# Altium schematic symbol library jlcpcb_2025_04_capacitors_extended_0805.schlib: 3281 symbols (part 9 of 18)
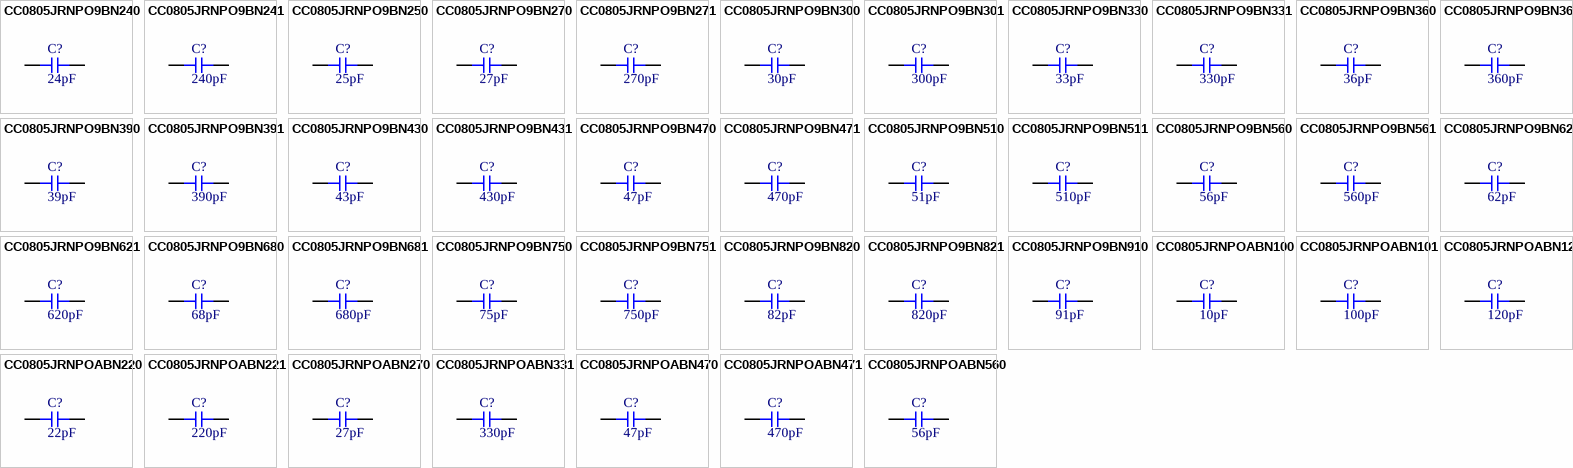
[diagram p90: symbols CC0805JRNPO9BN240 to CC0805JRNPOABN560]

## CC0805JRNPOABN220
designator C?  Capacitance: 22pF  (hidden comment: *)
Capacitor, Ceramic (MLCC), 22pF, ±5%, 200V, NP0, ±5%, SMD 0805; Manufacturer: YAGEO; Manufacturer Part Number: CC0805JRNPOABN220; Package Size: 0805; JLCPCB Basic Part: No; JLCPCB Part Number: C576968; Supplier 1: LCSC; Category: Capacitors - MLCC; Supplier Part Number 1: C576968; Tolerance: ±5%; Voltage Rating: 200V; Temperature Coefficient: NP0; RoHS: Yes; ComponentLink1Description: Datasheet; ComponentLink1URL: https://wmsc.lcsc.com/wmsc/upload/file/pdf/v2/lcsc/2209231730_YAGEO-CC0805JRNPOABN220_C576968.pdf; ComponentLink2Description: JLCPCB Part URL; ComponentLink2URL: https://jlcpcb.com/partdetail/C576968; ComponentLink3Description: LCSC Part URL; ComponentLink3URL: https://lcsc.com/product-detail/Multilayer-Ceramic-Capacitors-MLCC---SMD-SMT_YAGEO-YAGEO-CC0805JRNPOABN220_C576968.html
footprint CAP-0805 (0805 (2012M) Capacitor)
pins: 1, 2

## CC0805JRNPOABN221
designator C?  Capacitance: 220pF  (hidden comment: *)
Capacitor, Ceramic (MLCC), 220pF, ±5%, 200V, NP0, ±5%, SMD 0805; Manufacturer: YAGEO; Manufacturer Part Number: CC0805JRNPOABN221; Package Size: 0805; JLCPCB Basic Part: No; JLCPCB Part Number: C326848; Supplier 1: LCSC; Category: Capacitors - MLCC; Supplier Part Number 1: C326848; Tolerance: ±5%; Voltage Rating: 200V; Temperature Coefficient: NP0; RoHS: Yes; ComponentLink1Description: Datasheet; ComponentLink1URL: https://wmsc.lcsc.com/wmsc/upload/file/pdf/v2/lcsc/1811061214_YAGEO-CC0805JRNPOABN221_C326848.pdf; ComponentLink2Description: JLCPCB Part URL; ComponentLink2URL: https://jlcpcb.com/partdetail/C326848; ComponentLink3Description: LCSC Part URL; ComponentLink3URL: https://lcsc.com/product-detail/Multilayer-Ceramic-Capacitors-MLCC---SMD-SMT_YAGEO-YAGEO-CC0805JRNPOABN221_C326848.html
footprint CAP-0805 (0805 (2012M) Capacitor)
pins: 1, 2

## CC0805JRNPOABN270
designator C?  Capacitance: 27pF  (hidden comment: *)
Capacitor, Ceramic (MLCC), 27pF, ±5%, 200V, NP0, ±5%, SMD 0805; Manufacturer: YAGEO; Manufacturer Part Number: CC0805JRNPOABN270; Package Size: 0805; JLCPCB Basic Part: No; JLCPCB Part Number: C527209; Supplier 1: LCSC; Category: Capacitors - MLCC; Supplier Part Number 1: C527209; Tolerance: ±5%; Voltage Rating: 200V; Temperature Coefficient: NP0; RoHS: Yes; ComponentLink1Description: Datasheet; ComponentLink1URL: https://wmsc.lcsc.com/wmsc/upload/file/pdf/v2/lcsc/2006031835_YAGEO-CC0805JRNPOABN270_C527209.pdf; ComponentLink2Description: JLCPCB Part URL; ComponentLink2URL: https://jlcpcb.com/partdetail/C527209; ComponentLink3Description: LCSC Part URL; ComponentLink3URL: https://lcsc.com/product-detail/Multilayer-Ceramic-Capacitors-MLCC---SMD-SMT_YAGEO-YAGEO-CC0805JRNPOABN270_C527209.html
footprint CAP-0805 (0805 (2012M) Capacitor)
pins: 1, 2

## CC0805JRNPOABN331
designator C?  Capacitance: 330pF  (hidden comment: *)
Capacitor, Ceramic (MLCC), 330pF, ±5%, 200V, NP0, ±5%, SMD 0805; Manufacturer: YAGEO; Manufacturer Part Number: CC0805JRNPOABN331; Package Size: 0805; JLCPCB Basic Part: No; JLCPCB Part Number: C113837; Supplier 1: LCSC; Category: Capacitors - MLCC; Supplier Part Number 1: C113837; Tolerance: ±5%; Voltage Rating: 200V; Temperature Coefficient: NP0; RoHS: Yes; ComponentLink1Description: Datasheet; ComponentLink1URL: https://wmsc.lcsc.com/wmsc/upload/file/pdf/v2/lcsc/2304140030_YAGEO-CC0805JRNPOABN331_C113837.pdf; ComponentLink2Description: JLCPCB Part URL; ComponentLink2URL: https://jlcpcb.com/partdetail/C113837; ComponentLink3Description: LCSC Part URL; ComponentLink3URL: https://lcsc.com/product-detail/Multilayer-Ceramic-Capacitors-MLCC---SMD-SMT_YAGEO-YAGEO-CC0805JRNPOABN331_C113837.html
footprint CAP-0805 (0805 (2012M) Capacitor)
pins: 1, 2

## CC0805JRNPOABN470
designator C?  Capacitance: 47pF  (hidden comment: *)
Capacitor, Ceramic (MLCC), 47pF, ±5%, 200V, NP0, ±5%, SMD 0805; Manufacturer: YAGEO; Manufacturer Part Number: CC0805JRNPOABN470; Package Size: 0805; JLCPCB Basic Part: No; JLCPCB Part Number: C576969; Supplier 1: LCSC; Category: Capacitors - MLCC; Supplier Part Number 1: C576969; Tolerance: ±5%; Voltage Rating: 200V; Temperature Coefficient: NP0; RoHS: Yes; ComponentLink1Description: Datasheet; ComponentLink1URL: https://wmsc.lcsc.com/wmsc/upload/file/pdf/v2/lcsc/2006111833_YAGEO-CC0805JRNPOABN470_C576969.pdf; ComponentLink2Description: JLCPCB Part URL; ComponentLink2URL: https://jlcpcb.com/partdetail/C576969; ComponentLink3Description: LCSC Part URL; ComponentLink3URL: https://lcsc.com/product-detail/Multilayer-Ceramic-Capacitors-MLCC---SMD-SMT_YAGEO-YAGEO-CC0805JRNPOABN470_C576969.html
footprint CAP-0805 (0805 (2012M) Capacitor)
pins: 1, 2

## CC0805JRNPOABN471
designator C?  Capacitance: 470pF  (hidden comment: *)
Capacitor, Ceramic (MLCC), 470pF, ±5%, 200V, NP0, ±5%, SMD 0805; Manufacturer: YAGEO; Manufacturer Part Number: CC0805JRNPOABN471; Package Size: 0805; JLCPCB Basic Part: No; JLCPCB Part Number: C576970; Supplier 1: LCSC; Category: Capacitors - MLCC; Supplier Part Number 1: C576970; Tolerance: ±5%; Voltage Rating: 200V; Temperature Coefficient: NP0; RoHS: Yes; ComponentLink1Description: Datasheet; ComponentLink1URL: https://wmsc.lcsc.com/wmsc/upload/file/pdf/v2/lcsc/2204021130_YAGEO-CC0805JRNPOABN471_C576970.pdf; ComponentLink2Description: JLCPCB Part URL; ComponentLink2URL: https://jlcpcb.com/partdetail/C576970; ComponentLink3Description: LCSC Part URL; ComponentLink3URL: https://lcsc.com/product-detail/Multilayer-Ceramic-Capacitors-MLCC---SMD-SMT_YAGEO-YAGEO-CC0805JRNPOABN471_C576970.html
footprint CAP-0805 (0805 (2012M) Capacitor)
pins: 1, 2

## CC0805JRNPOABN560
designator C?  Capacitance: 56pF  (hidden comment: *)
Capacitor, Ceramic (MLCC), 56pF, ±5%, 200V, NP0, ±5%, SMD 0805; Manufacturer: YAGEO; Manufacturer Part Number: CC0805JRNPOABN560; Package Size: 0805; JLCPCB Basic Part: No; JLCPCB Part Number: C527210; Supplier 1: LCSC; Category: Capacitors - MLCC; Supplier Part Number 1: C527210; Tolerance: ±5%; Voltage Rating: 200V; Temperature Coefficient: NP0; RoHS: Yes; ComponentLink1Description: Datasheet; ComponentLink1URL: https://wmsc.lcsc.com/wmsc/upload/file/pdf/v2/lcsc/2005262134_YAGEO-CC0805JRNPOABN560_C527210.pdf; ComponentLink2Description: JLCPCB Part URL; ComponentLink2URL: https://jlcpcb.com/partdetail/C527210; ComponentLink3Description: LCSC Part URL; ComponentLink3URL: https://lcsc.com/product-detail/Multilayer-Ceramic-Capacitors-MLCC---SMD-SMT_YAGEO-YAGEO-CC0805JRNPOABN560_C527210.html
footprint CAP-0805 (0805 (2012M) Capacitor)
pins: 1, 2

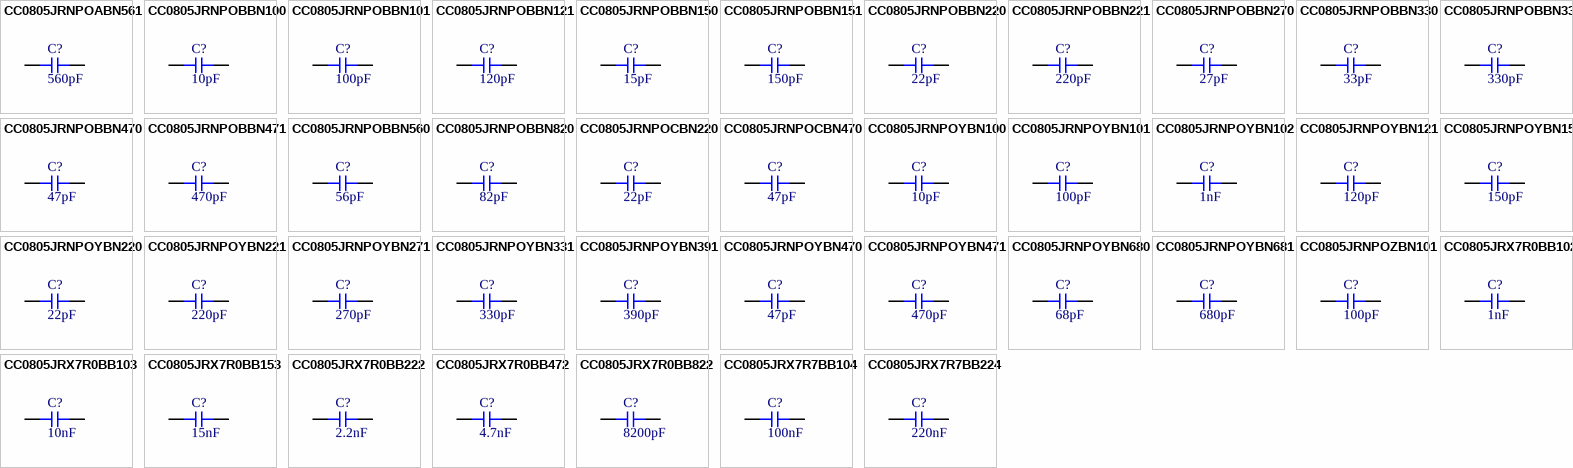
[diagram p37: symbols CC0805JRNPOABN561 to CC0805JRX7R7BB224]

## CC0805JRNPOABN561
designator C?  Capacitance: 560pF  (hidden comment: *)
Capacitor, Ceramic (MLCC), 560pF, ±5%, 200V, NP0, ±5%, SMD 0805; Manufacturer: YAGEO; Manufacturer Part Number: CC0805JRNPOABN561; Package Size: 0805; JLCPCB Basic Part: No; JLCPCB Part Number: C576971; Supplier 1: LCSC; Category: Capacitors - MLCC; Supplier Part Number 1: C576971; Tolerance: ±5%; Voltage Rating: 200V; Temperature Coefficient: NP0; RoHS: Yes; ComponentLink1Description: Datasheet; ComponentLink1URL: https://wmsc.lcsc.com/wmsc/upload/file/pdf/v2/lcsc/2006091814_YAGEO-CC0805JRNPOABN561_C576971.pdf; ComponentLink2Description: JLCPCB Part URL; ComponentLink2URL: https://jlcpcb.com/partdetail/C576971; ComponentLink3Description: LCSC Part URL; ComponentLink3URL: https://lcsc.com/product-detail/Multilayer-Ceramic-Capacitors-MLCC---SMD-SMT_YAGEO-YAGEO-CC0805JRNPOABN561_C576971.html
footprint CAP-0805 (0805 (2012M) Capacitor)
pins: 1, 2

## CC0805JRNPOBBN100
designator C?  Capacitance: 10pF  (hidden comment: *)
Capacitor, Ceramic (MLCC), 10pF, ±5%, 500V, NP0, ±5%, SMD 0805; Manufacturer: YAGEO; Manufacturer Part Number: CC0805JRNPOBBN100; Package Size: 0805; JLCPCB Basic Part: No; JLCPCB Part Number: C309488; Supplier 1: LCSC; Category: Capacitors - MLCC; Supplier Part Number 1: C309488; Tolerance: ±5%; Voltage Rating: 500V; Temperature Coefficient: NP0; RoHS: Yes; ComponentLink1Description: Datasheet; ComponentLink1URL: https://wmsc.lcsc.com/wmsc/upload/file/pdf/v2/lcsc/1811031143_YAGEO-CC0805JRNPOBBN100_C309488.pdf; ComponentLink2Description: JLCPCB Part URL; ComponentLink2URL: https://jlcpcb.com/partdetail/C309488; ComponentLink3Description: LCSC Part URL; ComponentLink3URL: https://lcsc.com/product-detail/Multilayer-Ceramic-Capacitors-MLCC---SMD-SMT_YAGEO-YAGEO-CC0805JRNPOBBN100_C309488.html
footprint CAP-0805 (0805 (2012M) Capacitor)
pins: 1, 2

## CC0805JRNPOBBN101
designator C?  Capacitance: 100pF  (hidden comment: *)
Capacitor, Ceramic (MLCC), 100pF, ±5%, 500V, NP0, ±5%, SMD 0805; Manufacturer: YAGEO; Manufacturer Part Number: CC0805JRNPOBBN101; Package Size: 0805; JLCPCB Basic Part: No; JLCPCB Part Number: C107122; Supplier 1: LCSC; Category: Capacitors - MLCC; Supplier Part Number 1: C107122; Tolerance: ±5%; Voltage Rating: 500V; Temperature Coefficient: NP0; RoHS: Yes; ComponentLink1Description: Datasheet; ComponentLink1URL: https://wmsc.lcsc.com/wmsc/upload/file/pdf/v2/lcsc/2304140030_YAGEO-CC0805JRNPOBBN101_C107122.pdf; ComponentLink2Description: JLCPCB Part URL; ComponentLink2URL: https://jlcpcb.com/partdetail/C107122; ComponentLink3Description: LCSC Part URL; ComponentLink3URL: https://lcsc.com/product-detail/Multilayer-Ceramic-Capacitors-MLCC---SMD-SMT_YAGEO-YAGEO-CC0805JRNPOBBN101_C107122.html
footprint CAP-0805 (0805 (2012M) Capacitor)
pins: 1, 2

## CC0805JRNPOBBN121
designator C?  Capacitance: 120pF  (hidden comment: *)
Capacitor, Ceramic (MLCC), 120pF, ±5%, 500V, NP0, ±5%, SMD 0805; Manufacturer: YAGEO; Manufacturer Part Number: CC0805JRNPOBBN121; Package Size: 0805; JLCPCB Basic Part: No; JLCPCB Part Number: C527211; Supplier 1: LCSC; Category: Capacitors - MLCC; Supplier Part Number 1: C527211; Tolerance: ±5%; Voltage Rating: 500V; Temperature Coefficient: NP0; RoHS: Yes; ComponentLink1Description: Datasheet; ComponentLink1URL: https://wmsc.lcsc.com/wmsc/upload/file/pdf/v2/lcsc/2006031835_YAGEO-CC0805JRNPOBBN121_C527211.pdf; ComponentLink2Description: JLCPCB Part URL; ComponentLink2URL: https://jlcpcb.com/partdetail/C527211; ComponentLink3Description: LCSC Part URL; ComponentLink3URL: https://lcsc.com/product-detail/Multilayer-Ceramic-Capacitors-MLCC---SMD-SMT_YAGEO-YAGEO-CC0805JRNPOBBN121_C527211.html
footprint CAP-0805 (0805 (2012M) Capacitor)
pins: 1, 2

## CC0805JRNPOBBN150
designator C?  Capacitance: 15pF  (hidden comment: *)
Capacitor, Ceramic (MLCC), 15pF, ±5%, 500V, NP0, ±5%, SMD 0805; Manufacturer: YAGEO; Manufacturer Part Number: CC0805JRNPOBBN150; Package Size: 0805; JLCPCB Basic Part: No; JLCPCB Part Number: C576974; Supplier 1: LCSC; Category: Capacitors - MLCC; Supplier Part Number 1: C576974; Tolerance: ±5%; Voltage Rating: 500V; Temperature Coefficient: NP0; RoHS: Yes; ComponentLink1Description: Datasheet; ComponentLink1URL: https://wmsc.lcsc.com/wmsc/upload/file/pdf/v2/lcsc/2204251630_YAGEO-CC0805JRNPOBBN150_C576974.pdf; ComponentLink2Description: JLCPCB Part URL; ComponentLink2URL: https://jlcpcb.com/partdetail/C576974; ComponentLink3Description: LCSC Part URL; ComponentLink3URL: https://lcsc.com/product-detail/Multilayer-Ceramic-Capacitors-MLCC---SMD-SMT_YAGEO-YAGEO-CC0805JRNPOBBN150_C576974.html
footprint CAP-0805 (0805 (2012M) Capacitor)
pins: 1, 2

## CC0805JRNPOBBN151
designator C?  Capacitance: 150pF  (hidden comment: *)
Capacitor, Ceramic (MLCC), 150pF, ±5%, 500V, NP0, ±5%, SMD 0805; Manufacturer: YAGEO; Manufacturer Part Number: CC0805JRNPOBBN151; Package Size: 0805; JLCPCB Basic Part: No; JLCPCB Part Number: C576975; Supplier 1: LCSC; Category: Capacitors - MLCC; Supplier Part Number 1: C576975; Tolerance: ±5%; Voltage Rating: 500V; Temperature Coefficient: NP0; RoHS: Yes; ComponentLink1Description: Datasheet; ComponentLink1URL: https://wmsc.lcsc.com/wmsc/upload/file/pdf/v2/lcsc/2008171234_YAGEO-CC0805JRNPOBBN151_C576975.pdf; ComponentLink2Description: JLCPCB Part URL; ComponentLink2URL: https://jlcpcb.com/partdetail/C576975; ComponentLink3Description: LCSC Part URL; ComponentLink3URL: https://lcsc.com/product-detail/Multilayer-Ceramic-Capacitors-MLCC---SMD-SMT_YAGEO-YAGEO-CC0805JRNPOBBN151_C576975.html
footprint CAP-0805 (0805 (2012M) Capacitor)
pins: 1, 2

## CC0805JRNPOBBN220
designator C?  Capacitance: 22pF  (hidden comment: *)
Capacitor, Ceramic (MLCC), 22pF, ±5%, 500V, NP0, ±5%, SMD 0805; Manufacturer: YAGEO; Manufacturer Part Number: CC0805JRNPOBBN220; Package Size: 0805; JLCPCB Basic Part: No; JLCPCB Part Number: C107123; Supplier 1: LCSC; Category: Capacitors - MLCC; Supplier Part Number 1: C107123; Tolerance: ±5%; Voltage Rating: 500V; Temperature Coefficient: NP0; RoHS: Yes; ComponentLink1Description: Datasheet; ComponentLink1URL: https://wmsc.lcsc.com/wmsc/upload/file/pdf/v2/lcsc/2304140030_YAGEO-CC0805JRNPOBBN220_C107123.pdf; ComponentLink2Description: JLCPCB Part URL; ComponentLink2URL: https://jlcpcb.com/partdetail/C107123; ComponentLink3Description: LCSC Part URL; ComponentLink3URL: https://lcsc.com/product-detail/Multilayer-Ceramic-Capacitors-MLCC---SMD-SMT_YAGEO-YAGEO-CC0805JRNPOBBN220_C107123.html
footprint CAP-0805 (0805 (2012M) Capacitor)
pins: 1, 2

## CC0805JRNPOBBN221
designator C?  Capacitance: 220pF  (hidden comment: *)
Capacitor, Ceramic (MLCC), 220pF, ±5%, 500V, NP0, ±5%, SMD 0805; Manufacturer: YAGEO; Manufacturer Part Number: CC0805JRNPOBBN221; Package Size: 0805; JLCPCB Basic Part: No; JLCPCB Part Number: C576977; Supplier 1: LCSC; Category: Capacitors - MLCC; Supplier Part Number 1: C576977; Tolerance: ±5%; Voltage Rating: 500V; Temperature Coefficient: NP0; RoHS: Yes; ComponentLink1Description: Datasheet; ComponentLink1URL: https://wmsc.lcsc.com/wmsc/upload/file/pdf/v2/lcsc/2008171234_YAGEO-CC0805JRNPOBBN221_C576977.pdf; ComponentLink2Description: JLCPCB Part URL; ComponentLink2URL: https://jlcpcb.com/partdetail/C576977; ComponentLink3Description: LCSC Part URL; ComponentLink3URL: https://lcsc.com/product-detail/Multilayer-Ceramic-Capacitors-MLCC---SMD-SMT_YAGEO-YAGEO-CC0805JRNPOBBN221_C576977.html
footprint CAP-0805 (0805 (2012M) Capacitor)
pins: 1, 2

## CC0805JRNPOBBN270
designator C?  Capacitance: 27pF  (hidden comment: *)
Capacitor, Ceramic (MLCC), 27pF, ±5%, 500V, NP0, ±5%, SMD 0805; Manufacturer: YAGEO; Manufacturer Part Number: CC0805JRNPOBBN270; Package Size: 0805; JLCPCB Basic Part: No; JLCPCB Part Number: C576978; Supplier 1: LCSC; Category: Capacitors - MLCC; Supplier Part Number 1: C576978; Tolerance: ±5%; Voltage Rating: 500V; Temperature Coefficient: NP0; RoHS: Yes; ComponentLink1Description: Datasheet; ComponentLink1URL: https://wmsc.lcsc.com/wmsc/upload/file/pdf/v2/lcsc/2209151800_YAGEO-CC0805JRNPOBBN270_C576978.pdf; ComponentLink2Description: JLCPCB Part URL; ComponentLink2URL: https://jlcpcb.com/partdetail/C576978; ComponentLink3Description: LCSC Part URL; ComponentLink3URL: https://lcsc.com/product-detail/Multilayer-Ceramic-Capacitors-MLCC---SMD-SMT_YAGEO-YAGEO-CC0805JRNPOBBN270_C576978.html
footprint CAP-0805 (0805 (2012M) Capacitor)
pins: 1, 2

## CC0805JRNPOBBN330
designator C?  Capacitance: 33pF  (hidden comment: *)
Capacitor, Ceramic (MLCC), 33pF, ±5%, 500V, NP0, ±5%, SMD 0805; Manufacturer: YAGEO; Manufacturer Part Number: CC0805JRNPOBBN330; Package Size: 0805; JLCPCB Basic Part: No; JLCPCB Part Number: C113838; Supplier 1: LCSC; Category: Capacitors - MLCC; Supplier Part Number 1: C113838; Tolerance: ±5%; Voltage Rating: 500V; Temperature Coefficient: NP0; RoHS: Yes; ComponentLink1Description: Datasheet; ComponentLink1URL: https://wmsc.lcsc.com/wmsc/upload/file/pdf/v2/lcsc/2304140030_YAGEO-CC0805JRNPOBBN330_C113838.pdf; ComponentLink2Description: JLCPCB Part URL; ComponentLink2URL: https://jlcpcb.com/partdetail/C113838; ComponentLink3Description: LCSC Part URL; ComponentLink3URL: https://lcsc.com/product-detail/Multilayer-Ceramic-Capacitors-MLCC---SMD-SMT_YAGEO-YAGEO-CC0805JRNPOBBN330_C113838.html
footprint CAP-0805 (0805 (2012M) Capacitor)
pins: 1, 2

## CC0805JRNPOBBN331
designator C?  Capacitance: 330pF  (hidden comment: *)
Capacitor, Ceramic (MLCC), 330pF, ±5%, 500V, NP0, ±5%, SMD 0805; Manufacturer: YAGEO; Manufacturer Part Number: CC0805JRNPOBBN331; Package Size: 0805; JLCPCB Basic Part: No; JLCPCB Part Number: C576979; Supplier 1: LCSC; Category: Capacitors - MLCC; Supplier Part Number 1: C576979; Tolerance: ±5%; Voltage Rating: 500V; Temperature Coefficient: NP0; RoHS: Yes; ComponentLink1Description: Datasheet; ComponentLink1URL: https://wmsc.lcsc.com/wmsc/upload/file/pdf/v2/lcsc/2008171234_YAGEO-CC0805JRNPOBBN331_C576979.pdf; ComponentLink2Description: JLCPCB Part URL; ComponentLink2URL: https://jlcpcb.com/partdetail/C576979; ComponentLink3Description: LCSC Part URL; ComponentLink3URL: https://lcsc.com/product-detail/Multilayer-Ceramic-Capacitors-MLCC---SMD-SMT_YAGEO-YAGEO-CC0805JRNPOBBN331_C576979.html
footprint CAP-0805 (0805 (2012M) Capacitor)
pins: 1, 2

## CC0805JRNPOBBN470
designator C?  Capacitance: 47pF  (hidden comment: *)
Capacitor, Ceramic (MLCC), 47pF, ±5%, 500V, NP0, ±5%, SMD 0805; Manufacturer: YAGEO; Manufacturer Part Number: CC0805JRNPOBBN470; Package Size: 0805; JLCPCB Basic Part: No; JLCPCB Part Number: C113839; Supplier 1: LCSC; Category: Capacitors - MLCC; Supplier Part Number 1: C113839; Tolerance: ±5%; Voltage Rating: 500V; Temperature Coefficient: NP0; RoHS: Yes; ComponentLink1Description: Datasheet; ComponentLink1URL: https://wmsc.lcsc.com/wmsc/upload/file/pdf/v2/lcsc/2304140030_YAGEO-CC0805JRNPOBBN470_C113839.pdf; ComponentLink2Description: JLCPCB Part URL; ComponentLink2URL: https://jlcpcb.com/partdetail/C113839; ComponentLink3Description: LCSC Part URL; ComponentLink3URL: https://lcsc.com/product-detail/Multilayer-Ceramic-Capacitors-MLCC---SMD-SMT_YAGEO-YAGEO-CC0805JRNPOBBN470_C113839.html
footprint CAP-0805 (0805 (2012M) Capacitor)
pins: 1, 2

## CC0805JRNPOBBN471
designator C?  Capacitance: 470pF  (hidden comment: *)
Capacitor, Ceramic (MLCC), 470pF, ±5%, 500V, NP0, ±5%, SMD 0805; Manufacturer: YAGEO; Manufacturer Part Number: CC0805JRNPOBBN471; Package Size: 0805; JLCPCB Basic Part: No; JLCPCB Part Number: C576981; Supplier 1: LCSC; Category: Capacitors - MLCC; Supplier Part Number 1: C576981; Tolerance: ±5%; Voltage Rating: 500V; Temperature Coefficient: NP0; RoHS: Yes; ComponentLink1Description: Datasheet; ComponentLink1URL: https://wmsc.lcsc.com/wmsc/upload/file/pdf/v2/lcsc/2204291416_YAGEO-CC0805JRNPOBBN471_C576981.pdf; ComponentLink2Description: JLCPCB Part URL; ComponentLink2URL: https://jlcpcb.com/partdetail/C576981; ComponentLink3Description: LCSC Part URL; ComponentLink3URL: https://lcsc.com/product-detail/Multilayer-Ceramic-Capacitors-MLCC---SMD-SMT_YAGEO-YAGEO-CC0805JRNPOBBN471_C576981.html
footprint CAP-0805 (0805 (2012M) Capacitor)
pins: 1, 2

## CC0805JRNPOBBN560
designator C?  Capacitance: 56pF  (hidden comment: *)
Capacitor, Ceramic (MLCC), 56pF, ±5%, 500V, NP0, ±5%, SMD 0805; Manufacturer: YAGEO; Manufacturer Part Number: CC0805JRNPOBBN560; Package Size: 0805; JLCPCB Basic Part: No; JLCPCB Part Number: C596325; Supplier 1: LCSC; Category: Capacitors - MLCC; Supplier Part Number 1: C596325; Tolerance: ±5%; Voltage Rating: 500V; Temperature Coefficient: NP0; RoHS: Yes; ComponentLink1Description: Datasheet; ComponentLink1URL: https://wmsc.lcsc.com/wmsc/upload/file/pdf/v2/lcsc/2006091816_YAGEO-CC0805JRNPOBBN560_C596325.pdf; ComponentLink2Description: JLCPCB Part URL; ComponentLink2URL: https://jlcpcb.com/partdetail/C596325; ComponentLink3Description: LCSC Part URL; ComponentLink3URL: https://lcsc.com/product-detail/Multilayer-Ceramic-Capacitors-MLCC---SMD-SMT_YAGEO-YAGEO-CC0805JRNPOBBN560_C596325.html
footprint CAP-0805 (0805 (2012M) Capacitor)
pins: 1, 2

## CC0805JRNPOBBN820
designator C?  Capacitance: 82pF  (hidden comment: *)
Capacitor, Ceramic (MLCC), 82pF, ±5%, 500V, C0G, ±5%, SMD 0805; Manufacturer: YAGEO; Manufacturer Part Number: CC0805JRNPOBBN820; Package Size: 0805; JLCPCB Basic Part: No; JLCPCB Part Number: C3836573; Supplier 1: LCSC; Category: Capacitors - MLCC; Supplier Part Number 1: C3836573; Tolerance: ±5%; Voltage Rating: 500V; Temperature Coefficient: C0G; RoHS: Yes; ComponentLink1Description: Datasheet; ComponentLink1URL: https://wmsc.lcsc.com/wmsc/upload/file/pdf/v2/lcsc/2311211121_YAGEO-CC0805JRNPOBBN820_C3836573.pdf; ComponentLink2Description: JLCPCB Part URL; ComponentLink2URL: https://jlcpcb.com/partdetail/C3836573; ComponentLink3Description: LCSC Part URL; ComponentLink3URL: https://lcsc.com/product-detail/Multilayer-Ceramic-Capacitors-MLCC---SMD-SMT_YAGEO-YAGEO-CC0805JRNPOBBN820_C3836573.html
footprint CAP-0805 (0805 (2012M) Capacitor)
pins: 1, 2

## CC0805JRNPOCBN220
designator C?  Capacitance: 22pF  (hidden comment: *)
Capacitor, Ceramic (MLCC), 22pF, ±5%, 1kV, NP0, ±5%, SMD 0805; Manufacturer: YAGEO; Manufacturer Part Number: CC0805JRNPOCBN220; Package Size: 0805; JLCPCB Basic Part: No; JLCPCB Part Number: C113840; Supplier 1: LCSC; Category: Capacitors - MLCC; Supplier Part Number 1: C113840; Tolerance: ±5%; Voltage Rating: 1kV; Temperature Coefficient: NP0; RoHS: Yes; ComponentLink1Description: Datasheet; ComponentLink1URL: https://wmsc.lcsc.com/wmsc/upload/file/pdf/v2/lcsc/2304140030_YAGEO-CC0805JRNPOCBN220_C113840.pdf; ComponentLink2Description: JLCPCB Part URL; ComponentLink2URL: https://jlcpcb.com/partdetail/C113840; ComponentLink3Description: LCSC Part URL; ComponentLink3URL: https://lcsc.com/product-detail/Multilayer-Ceramic-Capacitors-MLCC---SMD-SMT_YAGEO-YAGEO-CC0805JRNPOCBN220_C113840.html
footprint CAP-0805 (0805 (2012M) Capacitor)
pins: 1, 2

## CC0805JRNPOCBN470
designator C?  Capacitance: 47pF  (hidden comment: *)
Capacitor, Ceramic (MLCC), 47pF, ±5%, 1kV, NP0, ±5%, SMD 0805; Manufacturer: YAGEO; Manufacturer Part Number: CC0805JRNPOCBN470; Package Size: 0805; JLCPCB Basic Part: No; JLCPCB Part Number: C326634; Supplier 1: LCSC; Category: Capacitors - MLCC; Supplier Part Number 1: C326634; Tolerance: ±5%; Voltage Rating: 1kV; Temperature Coefficient: NP0; RoHS: Yes; ComponentLink1Description: Datasheet; ComponentLink1URL: https://wmsc.lcsc.com/wmsc/upload/file/pdf/v2/lcsc/2304140030_YAGEO-CC0805JRNPOCBN470_C326634.pdf; ComponentLink2Description: JLCPCB Part URL; ComponentLink2URL: https://jlcpcb.com/partdetail/C326634; ComponentLink3Description: LCSC Part URL; ComponentLink3URL: https://lcsc.com/product-detail/Multilayer-Ceramic-Capacitors-MLCC---SMD-SMT_YAGEO-YAGEO-CC0805JRNPOCBN470_C326634.html
footprint CAP-0805 (0805 (2012M) Capacitor)
pins: 1, 2

## CC0805JRNPOYBN100
designator C?  Capacitance: 10pF  (hidden comment: *)
Capacitor, Ceramic (MLCC), 10pF, ±5%, 250V, NP0, ±5%, SMD 0805; Manufacturer: YAGEO; Manufacturer Part Number: CC0805JRNPOYBN100; Package Size: 0805; JLCPCB Basic Part: No; JLCPCB Part Number: C527213; Supplier 1: LCSC; Category: Capacitors - MLCC; Supplier Part Number 1: C527213; Tolerance: ±5%; Voltage Rating: 250V; Temperature Coefficient: NP0; RoHS: Yes; ComponentLink1Description: Datasheet; ComponentLink1URL: https://wmsc.lcsc.com/wmsc/upload/file/pdf/v2/lcsc/2006101835_YAGEO-CC0805JRNPOYBN100_C527213.pdf; ComponentLink2Description: JLCPCB Part URL; ComponentLink2URL: https://jlcpcb.com/partdetail/C527213; ComponentLink3Description: LCSC Part URL; ComponentLink3URL: https://lcsc.com/product-detail/Multilayer-Ceramic-Capacitors-MLCC---SMD-SMT_YAGEO-YAGEO-CC0805JRNPOYBN100_C527213.html
footprint CAP-0805 (0805 (2012M) Capacitor)
pins: 1, 2

## CC0805JRNPOYBN101
designator C?  Capacitance: 100pF  (hidden comment: *)
Capacitor, Ceramic (MLCC), 100pF, ±5%, 250V, NP0, ±5%, SMD 0805; Manufacturer: YAGEO; Manufacturer Part Number: CC0805JRNPOYBN101; Package Size: 0805; JLCPCB Basic Part: No; JLCPCB Part Number: C576984; Supplier 1: LCSC; Category: Capacitors - MLCC; Supplier Part Number 1: C576984; Tolerance: ±5%; Voltage Rating: 250V; Temperature Coefficient: NP0; RoHS: Yes; ComponentLink1Description: Datasheet; ComponentLink1URL: https://wmsc.lcsc.com/wmsc/upload/file/pdf/v2/lcsc/2007231237_YAGEO-CC0805JRNPOYBN101_C576984.pdf; ComponentLink2Description: JLCPCB Part URL; ComponentLink2URL: https://jlcpcb.com/partdetail/C576984; ComponentLink3Description: LCSC Part URL; ComponentLink3URL: https://lcsc.com/product-detail/Multilayer-Ceramic-Capacitors-MLCC---SMD-SMT_YAGEO-YAGEO-CC0805JRNPOYBN101_C576984.html
footprint CAP-0805 (0805 (2012M) Capacitor)
pins: 1, 2

## CC0805JRNPOYBN102
designator C?  Capacitance: 1nF  (hidden comment: *)
Capacitor, Ceramic (MLCC), 1nF, ±5%, 250V, NP0, ±5%, SMD 0805; Manufacturer: YAGEO; Manufacturer Part Number: CC0805JRNPOYBN102; Package Size: 0805; JLCPCB Basic Part: No; JLCPCB Part Number: C527214; Supplier 1: LCSC; Category: Capacitors - MLCC; Supplier Part Number 1: C527214; Tolerance: ±5%; Voltage Rating: 250V; Temperature Coefficient: NP0; RoHS: Yes; ComponentLink1Description: Datasheet; ComponentLink1URL: https://wmsc.lcsc.com/wmsc/upload/file/pdf/v2/lcsc/2006241834_YAGEO-CC0805JRNPOYBN102_C527214.pdf; ComponentLink2Description: JLCPCB Part URL; ComponentLink2URL: https://jlcpcb.com/partdetail/C527214; ComponentLink3Description: LCSC Part URL; ComponentLink3URL: https://lcsc.com/product-detail/Multilayer-Ceramic-Capacitors-MLCC---SMD-SMT_YAGEO-YAGEO-CC0805JRNPOYBN102_C527214.html
footprint CAP-0805 (0805 (2012M) Capacitor)
pins: 1, 2

## CC0805JRNPOYBN121
designator C?  Capacitance: 120pF  (hidden comment: *)
Capacitor, Ceramic (MLCC), 120pF, ±5%, 250V, NP0, ±5%, SMD 0805; Manufacturer: YAGEO; Manufacturer Part Number: CC0805JRNPOYBN121; Package Size: 0805; JLCPCB Basic Part: No; JLCPCB Part Number: C527215; Supplier 1: LCSC; Category: Capacitors - MLCC; Supplier Part Number 1: C527215; Tolerance: ±5%; Voltage Rating: 250V; Temperature Coefficient: NP0; RoHS: Yes; ComponentLink1Description: Datasheet; ComponentLink1URL: https://wmsc.lcsc.com/wmsc/upload/file/pdf/v2/lcsc/2007021836_YAGEO-CC0805JRNPOYBN121_C527215.pdf; ComponentLink2Description: JLCPCB Part URL; ComponentLink2URL: https://jlcpcb.com/partdetail/C527215; ComponentLink3Description: LCSC Part URL; ComponentLink3URL: https://lcsc.com/product-detail/Multilayer-Ceramic-Capacitors-MLCC---SMD-SMT_YAGEO-YAGEO-CC0805JRNPOYBN121_C527215.html
footprint CAP-0805 (0805 (2012M) Capacitor)
pins: 1, 2

## CC0805JRNPOYBN151
designator C?  Capacitance: 150pF  (hidden comment: *)
Capacitor, Ceramic (MLCC), 150pF, ±5%, 250V, NP0, ±5%, SMD 0805; Manufacturer: YAGEO; Manufacturer Part Number: CC0805JRNPOYBN151; Package Size: 0805; JLCPCB Basic Part: No; JLCPCB Part Number: C513599; Supplier 1: LCSC; Category: Capacitors - MLCC; Supplier Part Number 1: C513599; Tolerance: ±5%; Voltage Rating: 250V; Temperature Coefficient: NP0; RoHS: Yes; ComponentLink1Description: Datasheet; ComponentLink1URL: https://wmsc.lcsc.com/wmsc/upload/file/pdf/v2/lcsc/2004231433_YAGEO-CC0805JRNPOYBN151_C513599.pdf; ComponentLink2Description: JLCPCB Part URL; ComponentLink2URL: https://jlcpcb.com/partdetail/C513599; ComponentLink3Description: LCSC Part URL; ComponentLink3URL: https://lcsc.com/product-detail/Multilayer-Ceramic-Capacitors-MLCC---SMD-SMT_YAGEO-YAGEO-CC0805JRNPOYBN151_C513599.html
footprint CAP-0805 (0805 (2012M) Capacitor)
pins: 1, 2

## CC0805JRNPOYBN220
designator C?  Capacitance: 22pF  (hidden comment: *)
Capacitor, Ceramic (MLCC), 22pF, ±5%, 250V, NP0, ±5%, SMD 0805; Manufacturer: YAGEO; Manufacturer Part Number: CC0805JRNPOYBN220; Package Size: 0805; JLCPCB Basic Part: No; JLCPCB Part Number: C90626; Supplier 1: LCSC; Category: Capacitors - MLCC; Supplier Part Number 1: C90626; Tolerance: ±5%; Voltage Rating: 250V; Temperature Coefficient: NP0; RoHS: Yes; ComponentLink1Description: Datasheet; ComponentLink1URL: https://wmsc.lcsc.com/wmsc/upload/file/pdf/v2/lcsc/2304140030_YAGEO-CC0805JRNPOYBN220_C90626.pdf; ComponentLink2Description: JLCPCB Part URL; ComponentLink2URL: https://jlcpcb.com/partdetail/C90626; ComponentLink3Description: LCSC Part URL; ComponentLink3URL: https://lcsc.com/product-detail/Multilayer-Ceramic-Capacitors-MLCC---SMD-SMT_YAGEO-YAGEO-CC0805JRNPOYBN220_C90626.html
footprint CAP-0805 (0805 (2012M) Capacitor)
pins: 1, 2

## CC0805JRNPOYBN221
designator C?  Capacitance: 220pF  (hidden comment: *)
Capacitor, Ceramic (MLCC), 220pF, ±5%, 250V, NP0, ±5%, SMD 0805; Manufacturer: YAGEO; Manufacturer Part Number: CC0805JRNPOYBN221; Package Size: 0805; JLCPCB Basic Part: No; JLCPCB Part Number: C576985; Supplier 1: LCSC; Category: Capacitors - MLCC; Supplier Part Number 1: C576985; Tolerance: ±5%; Voltage Rating: 250V; Temperature Coefficient: NP0; RoHS: Yes; ComponentLink1Description: Datasheet; ComponentLink1URL: https://wmsc.lcsc.com/wmsc/upload/file/pdf/v2/lcsc/2006091814_YAGEO-CC0805JRNPOYBN221_C576985.pdf; ComponentLink2Description: JLCPCB Part URL; ComponentLink2URL: https://jlcpcb.com/partdetail/C576985; ComponentLink3Description: LCSC Part URL; ComponentLink3URL: https://lcsc.com/product-detail/Multilayer-Ceramic-Capacitors-MLCC---SMD-SMT_YAGEO-YAGEO-CC0805JRNPOYBN221_C576985.html
footprint CAP-0805 (0805 (2012M) Capacitor)
pins: 1, 2

## CC0805JRNPOYBN271
designator C?  Capacitance: 270pF  (hidden comment: *)
Capacitor, Ceramic (MLCC), 270pF, ±5%, 250V, NP0, ±5%, SMD 0805; Manufacturer: YAGEO; Manufacturer Part Number: CC0805JRNPOYBN271; Package Size: 0805; JLCPCB Basic Part: No; JLCPCB Part Number: C527216; Supplier 1: LCSC; Category: Capacitors - MLCC; Supplier Part Number 1: C527216; Tolerance: ±5%; Voltage Rating: 250V; Temperature Coefficient: NP0; RoHS: Yes; ComponentLink1Description: Datasheet; ComponentLink1URL: https://wmsc.lcsc.com/wmsc/upload/file/pdf/v2/lcsc/2005222141_YAGEO-CC0805JRNPOYBN271_C527216.pdf; ComponentLink2Description: JLCPCB Part URL; ComponentLink2URL: https://jlcpcb.com/partdetail/C527216; ComponentLink3Description: LCSC Part URL; ComponentLink3URL: https://lcsc.com/product-detail/Multilayer-Ceramic-Capacitors-MLCC---SMD-SMT_YAGEO-YAGEO-CC0805JRNPOYBN271_C527216.html
footprint CAP-0805 (0805 (2012M) Capacitor)
pins: 1, 2

## CC0805JRNPOYBN331
designator C?  Capacitance: 330pF  (hidden comment: *)
Capacitor, Ceramic (MLCC), 330pF, ±5%, 250V, NP0, ±5%, SMD 0805; Manufacturer: YAGEO; Manufacturer Part Number: CC0805JRNPOYBN331; Package Size: 0805; JLCPCB Basic Part: No; JLCPCB Part Number: C527217; Supplier 1: LCSC; Category: Capacitors - MLCC; Supplier Part Number 1: C527217; Tolerance: ±5%; Voltage Rating: 250V; Temperature Coefficient: NP0; RoHS: Yes; ComponentLink1Description: Datasheet; ComponentLink1URL: https://wmsc.lcsc.com/wmsc/upload/file/pdf/v2/lcsc/2005262135_YAGEO-CC0805JRNPOYBN331_C527217.pdf; ComponentLink2Description: JLCPCB Part URL; ComponentLink2URL: https://jlcpcb.com/partdetail/C527217; ComponentLink3Description: LCSC Part URL; ComponentLink3URL: https://lcsc.com/product-detail/Multilayer-Ceramic-Capacitors-MLCC---SMD-SMT_YAGEO-YAGEO-CC0805JRNPOYBN331_C527217.html
footprint CAP-0805 (0805 (2012M) Capacitor)
pins: 1, 2

## CC0805JRNPOYBN391
designator C?  Capacitance: 390pF  (hidden comment: *)
Capacitor, Ceramic (MLCC), 390pF, ±5%, 250V, NP0, ±5%, SMD 0805; Manufacturer: YAGEO; Manufacturer Part Number: CC0805JRNPOYBN391; Package Size: 0805; JLCPCB Basic Part: No; JLCPCB Part Number: C596324; Supplier 1: LCSC; Category: Capacitors - MLCC; Supplier Part Number 1: C596324; Tolerance: ±5%; Voltage Rating: 250V; Temperature Coefficient: NP0; RoHS: Yes; ComponentLink1Description: Datasheet; ComponentLink1URL: https://wmsc.lcsc.com/wmsc/upload/file/pdf/v2/lcsc/2006091816_YAGEO-CC0805JRNPOYBN391_C596324.pdf; ComponentLink2Description: JLCPCB Part URL; ComponentLink2URL: https://jlcpcb.com/partdetail/C596324; ComponentLink3Description: LCSC Part URL; ComponentLink3URL: https://lcsc.com/product-detail/Multilayer-Ceramic-Capacitors-MLCC---SMD-SMT_YAGEO-YAGEO-CC0805JRNPOYBN391_C596324.html
footprint CAP-0805 (0805 (2012M) Capacitor)
pins: 1, 2

## CC0805JRNPOYBN470
designator C?  Capacitance: 47pF  (hidden comment: *)
Capacitor, Ceramic (MLCC), 47pF, ±5%, 250V, NP0, ±5%, SMD 0805; Manufacturer: YAGEO; Manufacturer Part Number: CC0805JRNPOYBN470; Package Size: 0805; JLCPCB Basic Part: No; JLCPCB Part Number: C340107; Supplier 1: LCSC; Category: Capacitors - MLCC; Supplier Part Number 1: C340107; Tolerance: ±5%; Voltage Rating: 250V; Temperature Coefficient: NP0; RoHS: Yes; ComponentLink1Description: Datasheet; ComponentLink1URL: https://wmsc.lcsc.com/wmsc/upload/file/pdf/v2/lcsc/2005111003_YAGEO-CC0805JRNPOYBN470_C340107.pdf; ComponentLink2Description: JLCPCB Part URL; ComponentLink2URL: https://jlcpcb.com/partdetail/C340107; ComponentLink3Description: LCSC Part URL; ComponentLink3URL: https://lcsc.com/product-detail/Multilayer-Ceramic-Capacitors-MLCC---SMD-SMT_YAGEO-YAGEO-CC0805JRNPOYBN470_C340107.html
footprint CAP-0805 (0805 (2012M) Capacitor)
pins: 1, 2

## CC0805JRNPOYBN471
designator C?  Capacitance: 470pF  (hidden comment: *)
Capacitor, Ceramic (MLCC), 470pF, ±5%, 250V, NP0, ±5%, SMD 0805; Manufacturer: YAGEO; Manufacturer Part Number: CC0805JRNPOYBN471; Package Size: 0805; JLCPCB Basic Part: No; JLCPCB Part Number: C277525; Supplier 1: LCSC; Category: Capacitors - MLCC; Supplier Part Number 1: C277525; Tolerance: ±5%; Voltage Rating: 250V; Temperature Coefficient: NP0; RoHS: Yes; ComponentLink1Description: Datasheet; ComponentLink1URL: https://wmsc.lcsc.com/wmsc/upload/file/pdf/v2/lcsc/2304140030_YAGEO-CC0805JRNPOYBN471_C277525.pdf; ComponentLink2Description: JLCPCB Part URL; ComponentLink2URL: https://jlcpcb.com/partdetail/C277525; ComponentLink3Description: LCSC Part URL; ComponentLink3URL: https://lcsc.com/product-detail/Multilayer-Ceramic-Capacitors-MLCC---SMD-SMT_YAGEO-YAGEO-CC0805JRNPOYBN471_C277525.html
footprint CAP-0805 (0805 (2012M) Capacitor)
pins: 1, 2

## CC0805JRNPOYBN680
designator C?  Capacitance: 68pF  (hidden comment: *)
Capacitor, Ceramic (MLCC), 68pF, ±5%, 250V, NP0, ±5%, SMD 0805; Manufacturer: YAGEO; Manufacturer Part Number: CC0805JRNPOYBN680; Package Size: 0805; JLCPCB Basic Part: No; JLCPCB Part Number: C1853012; Supplier 1: LCSC; Category: Capacitors - MLCC; Supplier Part Number 1: C1853012; Tolerance: ±5%; Voltage Rating: 250V; Temperature Coefficient: NP0; RoHS: Yes; ComponentLink1Description: Datasheet; ComponentLink1URL: https://wmsc.lcsc.com/wmsc/upload/file/pdf/v2/lcsc/2201271030_YAGEO-CC0805JRNPOYBN680_C1853012.pdf; ComponentLink2Description: JLCPCB Part URL; ComponentLink2URL: https://jlcpcb.com/partdetail/C1853012; ComponentLink3Description: LCSC Part URL; ComponentLink3URL: https://lcsc.com/product-detail/Multilayer-Ceramic-Capacitors-MLCC---SMD-SMT_YAGEO-YAGEO-CC0805JRNPOYBN680_C1853012.html
footprint CAP-0805 (0805 (2012M) Capacitor)
pins: 1, 2

## CC0805JRNPOYBN681
designator C?  Capacitance: 680pF  (hidden comment: *)
Capacitor, Ceramic (MLCC), 680pF, ±5%, 250V, NP0, ±5%, SMD 0805; Manufacturer: YAGEO; Manufacturer Part Number: CC0805JRNPOYBN681; Package Size: 0805; JLCPCB Basic Part: No; JLCPCB Part Number: C277495; Supplier 1: LCSC; Category: Capacitors - MLCC; Supplier Part Number 1: C277495; Tolerance: ±5%; Voltage Rating: 250V; Temperature Coefficient: NP0; RoHS: Yes; ComponentLink1Description: Datasheet; ComponentLink1URL: https://wmsc.lcsc.com/wmsc/upload/file/pdf/v2/lcsc/2304140030_YAGEO-CC0805JRNPOYBN681_C277495.pdf; ComponentLink2Description: JLCPCB Part URL; ComponentLink2URL: https://jlcpcb.com/partdetail/C277495; ComponentLink3Description: LCSC Part URL; ComponentLink3URL: https://lcsc.com/product-detail/Multilayer-Ceramic-Capacitors-MLCC---SMD-SMT_YAGEO-YAGEO-CC0805JRNPOYBN681_C277495.html
footprint CAP-0805 (0805 (2012M) Capacitor)
pins: 1, 2

## CC0805JRNPOZBN101
designator C?  Capacitance: 100pF  (hidden comment: *)
Capacitor, Ceramic (MLCC), 100pF, ±5%, 630V, NP0, ±5%, SMD 0805; Manufacturer: YAGEO; Manufacturer Part Number: CC0805JRNPOZBN101; Package Size: 0805; JLCPCB Basic Part: No; JLCPCB Part Number: C576990; Supplier 1: LCSC; Category: Capacitors - MLCC; Supplier Part Number 1: C576990; Tolerance: ±5%; Voltage Rating: 630V; Temperature Coefficient: NP0; RoHS: Yes; ComponentLink1Description: Datasheet; ComponentLink1URL: https://wmsc.lcsc.com/wmsc/upload/file/pdf/v2/lcsc/2209282030_YAGEO-CC0805JRNPOZBN101_C576990.pdf; ComponentLink2Description: JLCPCB Part URL; ComponentLink2URL: https://jlcpcb.com/partdetail/C576990; ComponentLink3Description: LCSC Part URL; ComponentLink3URL: https://lcsc.com/product-detail/Multilayer-Ceramic-Capacitors-MLCC---SMD-SMT_YAGEO-YAGEO-CC0805JRNPOZBN101_C576990.html
footprint CAP-0805 (0805 (2012M) Capacitor)
pins: 1, 2

## CC0805JRX7R0BB102
designator C?  Capacitance: 1nF  (hidden comment: *)
Capacitor, Ceramic (MLCC), 1nF, ±5%, 100V, X7R, ±5%, SMD 0805; Manufacturer: YAGEO; Manufacturer Part Number: CC0805JRX7R0BB102; Package Size: 0805; JLCPCB Basic Part: No; JLCPCB Part Number: C156239; Supplier 1: LCSC; Category: Capacitors - MLCC; Supplier Part Number 1: C156239; Tolerance: ±5%; Voltage Rating: 100V; Temperature Coefficient: X7R; RoHS: Yes; ComponentLink1Description: Datasheet; ComponentLink1URL: https://wmsc.lcsc.com/wmsc/upload/file/pdf/v2/lcsc/2304140030_YAGEO-CC0805JRX7R0BB102_C156239.pdf; ComponentLink2Description: JLCPCB Part URL; ComponentLink2URL: https://jlcpcb.com/partdetail/C156239; ComponentLink3Description: LCSC Part URL; ComponentLink3URL: https://lcsc.com/product-detail/Multilayer-Ceramic-Capacitors-MLCC---SMD-SMT_YAGEO-YAGEO-CC0805JRX7R0BB102_C156239.html
footprint CAP-0805 (0805 (2012M) Capacitor)
pins: 1, 2

## CC0805JRX7R0BB103
designator C?  Capacitance: 10nF  (hidden comment: *)
Capacitor, Ceramic (MLCC), 10nF, ±5%, 100V, X7R, ±5%, SMD 0805; Manufacturer: YAGEO; Manufacturer Part Number: CC0805JRX7R0BB103; Package Size: 0805; JLCPCB Basic Part: No; JLCPCB Part Number: C513567; Supplier 1: LCSC; Category: Capacitors - MLCC; Supplier Part Number 1: C513567; Tolerance: ±5%; Voltage Rating: 100V; Temperature Coefficient: X7R; RoHS: Yes; ComponentLink1Description: Datasheet; ComponentLink1URL: https://wmsc.lcsc.com/wmsc/upload/file/pdf/v2/lcsc/2006091812_YAGEO-CC0805JRX7R0BB103_C513567.pdf; ComponentLink2Description: JLCPCB Part URL; ComponentLink2URL: https://jlcpcb.com/partdetail/C513567; ComponentLink3Description: LCSC Part URL; ComponentLink3URL: https://lcsc.com/product-detail/Multilayer-Ceramic-Capacitors-MLCC---SMD-SMT_YAGEO-YAGEO-CC0805JRX7R0BB103_C513567.html
footprint CAP-0805 (0805 (2012M) Capacitor)
pins: 1, 2

## CC0805JRX7R0BB153
designator C?  Capacitance: 15nF  (hidden comment: *)
Capacitor, Ceramic (MLCC), 15nF, ±5%, 100V, X7R, ±5%, SMD 0805; Manufacturer: YAGEO; Manufacturer Part Number: CC0805JRX7R0BB153; Package Size: 0805; JLCPCB Basic Part: No; JLCPCB Part Number: C527218; Supplier 1: LCSC; Category: Capacitors - MLCC; Supplier Part Number 1: C527218; Tolerance: ±5%; Voltage Rating: 100V; Temperature Coefficient: X7R; RoHS: Yes; ComponentLink1Description: Datasheet; ComponentLink1URL: https://wmsc.lcsc.com/wmsc/upload/file/pdf/v2/lcsc/2008201233_YAGEO-CC0805JRX7R0BB153_C527218.pdf; ComponentLink2Description: JLCPCB Part URL; ComponentLink2URL: https://jlcpcb.com/partdetail/C527218; ComponentLink3Description: LCSC Part URL; ComponentLink3URL: https://lcsc.com/product-detail/Multilayer-Ceramic-Capacitors-MLCC---SMD-SMT_YAGEO-YAGEO-CC0805JRX7R0BB153_C527218.html
footprint CAP-0805 (0805 (2012M) Capacitor)
pins: 1, 2

## CC0805JRX7R0BB222
designator C?  Capacitance: 2.2nF  (hidden comment: *)
Capacitor, Ceramic (MLCC), 2.2nF, ±5%, 100V, X7R, ±5%, SMD 0805; Manufacturer: YAGEO; Manufacturer Part Number: CC0805JRX7R0BB222; Package Size: 0805; JLCPCB Basic Part: No; JLCPCB Part Number: C527219; Supplier 1: LCSC; Category: Capacitors - MLCC; Supplier Part Number 1: C527219; Tolerance: ±5%; Voltage Rating: 100V; Temperature Coefficient: X7R; RoHS: Yes; ComponentLink1Description: Datasheet; ComponentLink1URL: https://wmsc.lcsc.com/wmsc/upload/file/pdf/v2/lcsc/2006031835_YAGEO-CC0805JRX7R0BB222_C527219.pdf; ComponentLink2Description: JLCPCB Part URL; ComponentLink2URL: https://jlcpcb.com/partdetail/C527219; ComponentLink3Description: LCSC Part URL; ComponentLink3URL: https://lcsc.com/product-detail/Multilayer-Ceramic-Capacitors-MLCC---SMD-SMT_YAGEO-YAGEO-CC0805JRX7R0BB222_C527219.html
footprint CAP-0805 (0805 (2012M) Capacitor)
pins: 1, 2
